# Altium footprint library 1.27插件排针.PcbLib: 49 footprints (part 2 of 4)
Each footprint in its own frame and in the unit in brackets; x right, y up, seen from the top. Pads: shape width x height; smd on the part's side, far side on the other; paste and mask are expansions set on the pad; w line width, h text height; cw(c..) or ccw(c..) is an arc to the next point about the centre after c.
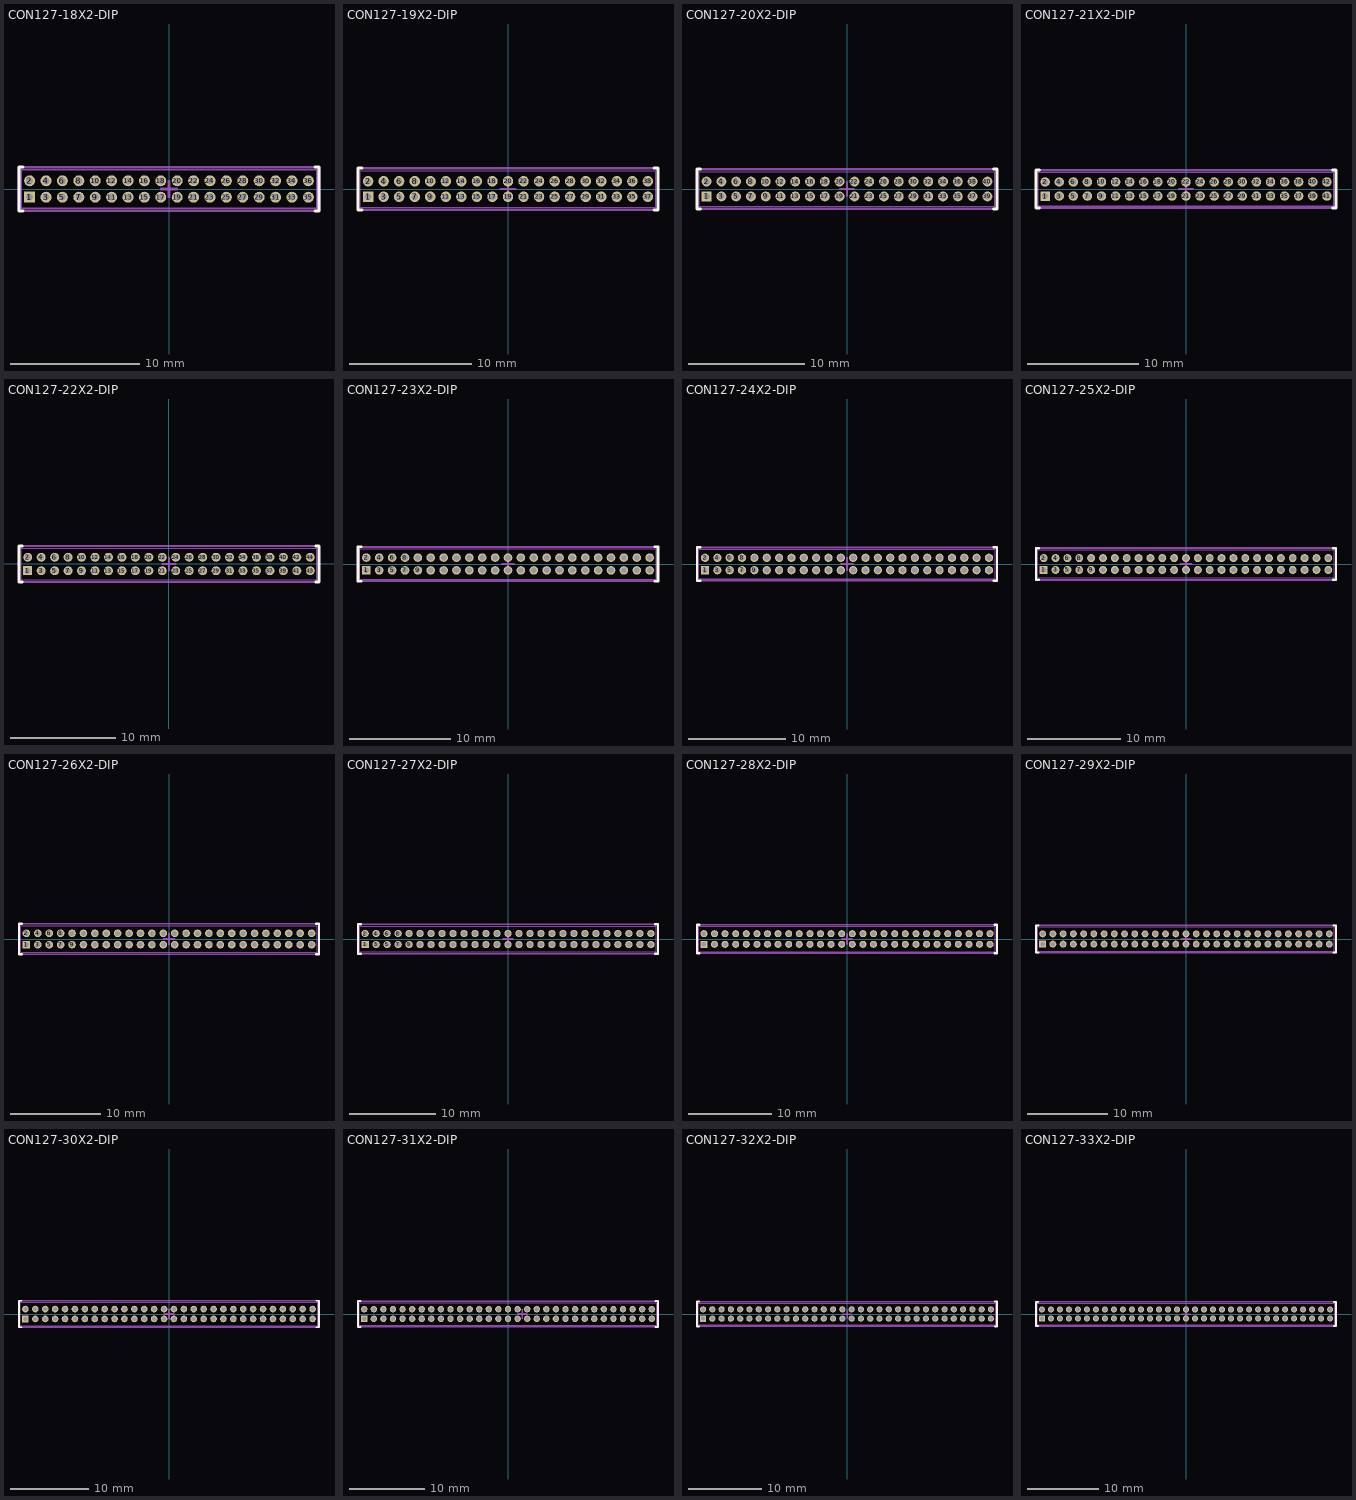
[diagram p1: the footprints below, top view; thin cyan lines are the x and y axes]

## CON127-18X2-DIP [mm] "1.27mm脚距18*2 双排针 -55°C to+105°C 450V AC"
height 3.5
pads (36):
  rect 0.85x0.85 hole 0.55 unplated: 1(-10.795,-0.635)
  round 0.85 hole 0.55 unplated: 2(-10.795,0.635) 3(-9.525,-0.635) 4(-9.525,0.635) 5(-8.255,-0.635) 6(-8.255,0.635) 7(-6.985,-0.635) 8(-6.985,0.635) 9(-5.715,-0.635) 10(-5.715,0.635) 11(-4.445,-0.635) 12(-4.445,0.635) 13(-3.175,-0.635) 14(-3.175,0.635) 15(-1.905,-0.635) 16(-1.905,0.635) 17(-0.635,-0.635) 18(-0.635,0.635) 19(0.635,-0.635) 20(0.635,0.635) 21(1.905,-0.635) 22(1.905,0.635) 23(3.175,-0.635) 24(3.175,0.635) 25(4.445,-0.635) 26(4.445,0.635) 27(5.715,-0.635) 28(5.715,0.635) 29(6.985,-0.635) 30(6.985,0.635) 31(8.255,-0.635) 32(8.255,0.635) 33(9.525,-0.635) 34(9.525,0.635) 35(10.795,-0.635) 36(10.795,0.635)
Top Overlay:
  lines w0.254: -11.303,-1.7 -11.62,-1.7 -11.62,1.7 -11.303,1.7 ; 11.303,-1.7 11.62,-1.7 11.62,1.7 11.303,1.7
Mechanical 13:
  lines w0.1: -11.43,-1.499 -11.43,1.501 ; -11.43,-1.499 11.43,-1.499 ; -11.43,-1.499 -11.43,1.501 ; -11.43,1.501 11.43,1.501 ; 11.43,-1.499 11.43,1.501 ; 11.43,-1.499 11.43,1.501
Mechanical 15:
  lines w0.2: -0.6,0 0.6,0 ; 0,-0.6 0,0.6 ; -11.62,-1.7 -11.62,1.7 11.62,1.7 11.62,-1.7 -11.62,-1.7
3D body: height 3.8, standoff -1.8, extent -11.43,-1.499 11.43,1.501

## CON127-19X2-DIP [mm] "1.27mm脚距19*2 双排针 -55°C to+105°C 450V AC"
height 3.5
pads (38):
  rect 0.85x0.85 hole 0.55 unplated: 1(-11.43,-0.635)
  round 0.85 hole 0.55 unplated: 2(-11.43,0.635) 3(-10.16,-0.635) 4(-10.16,0.635) 5(-8.89,-0.635) 6(-8.89,0.635) 7(-7.62,-0.635) 8(-7.62,0.635) 9(-6.35,-0.635) 10(-6.35,0.635) 11(-5.08,-0.635) 12(-5.08,0.635) 13(-3.81,-0.635) 14(-3.81,0.635) 15(-2.54,-0.635) 16(-2.54,0.635) 17(-1.27,-0.635) 18(-1.27,0.635) 19(0,-0.635) 20(0,0.635) 21(1.27,-0.635) 22(1.27,0.635) 23(2.54,-0.635) 24(2.54,0.635) 25(3.81,-0.635) 26(3.81,0.635) 27(5.08,-0.635) 28(5.08,0.635) 29(6.35,-0.635) 30(6.35,0.635) 31(7.62,-0.635) 32(7.62,0.635) 33(8.89,-0.635) 34(8.89,0.635) 35(10.16,-0.635) 36(10.16,0.635) 37(11.43,-0.635) 38(11.43,0.635)
Top Overlay:
  lines w0.254: -11.938,-1.7 -12.255,-1.7 -12.255,1.7 -11.938,1.7 ; 11.938,-1.7 12.255,-1.7 12.255,1.7 11.938,1.7
Mechanical 13:
  lines w0.1: -12.065,-1.499 -12.065,1.501 ; -12.065,-1.499 12.065,-1.499 ; -12.065,-1.499 -12.065,1.501 ; -12.065,1.501 12.065,1.501 ; 12.065,-1.499 12.065,1.501 ; 12.065,-1.499 12.065,1.501
Mechanical 15:
  lines w0.2: -0.6,0 0.6,0 ; 0,-0.6 0,0.6 ; -12.255,-1.7 -12.255,1.7 12.255,1.7 12.255,-1.7 -12.255,-1.7
3D body: height 3.8, standoff -1.8, extent -12.065,-1.499 12.065,1.501

## CON127-20X2-DIP [mm] "1.27mm脚距20*2 双排针 -55°C to+105°C 450V AC"
height 3.5
pads (40):
  rect 0.85x0.85 hole 0.55 unplated: 1(-12.065,-0.635)
  round 0.85 hole 0.55 unplated: 2(-12.065,0.635) 3(-10.795,-0.635) 4(-10.795,0.635) 5(-9.525,-0.635) 6(-9.525,0.635) 7(-8.255,-0.635) 8(-8.255,0.635) 9(-6.985,-0.635) 10(-6.985,0.635) 11(-5.715,-0.635) 12(-5.715,0.635) 13(-4.445,-0.635) 14(-4.445,0.635) 15(-3.175,-0.635) 16(-3.175,0.635) 17(-1.905,-0.635) 18(-1.905,0.635) 19(-0.635,-0.635) 20(-0.635,0.635) 21(0.635,-0.635) 22(0.635,0.635) 23(1.905,-0.635) 24(1.905,0.635) 25(3.175,-0.635) 26(3.175,0.635) 27(4.445,-0.635) 28(4.445,0.635) 29(5.715,-0.635) 30(5.715,0.635) 31(6.985,-0.635) 32(6.985,0.635) 33(8.255,-0.635) 34(8.255,0.635) 35(9.525,-0.635) 36(9.525,0.635) 37(10.795,-0.635) 38(10.795,0.635) 39(12.065,-0.635) 40(12.065,0.635)
Top Overlay:
  lines w0.254: -12.573,-1.7 -12.89,-1.7 -12.89,1.7 -12.573,1.7 ; 12.573,-1.7 12.89,-1.7 12.89,1.7 12.573,1.7
Mechanical 13:
  lines w0.1: -12.7,-1.499 -12.7,1.501 ; -12.7,-1.499 12.7,-1.499 ; -12.7,-1.499 -12.7,1.501 ; -12.7,1.501 12.7,1.501 ; 12.7,-1.499 12.7,1.501 ; 12.7,-1.499 12.7,1.501
Mechanical 15:
  lines w0.2: -0.6,0 0.6,0 ; 0,-0.6 0,0.6 ; -12.89,-1.7 -12.89,1.7 12.89,1.7 12.89,-1.7 -12.89,-1.7
3D body: height 3.8, standoff -1.8, extent -12.7,-1.499 12.7,1.501

## CON127-21X2-DIP [mm] "1.27mm脚距21*2 双排针 -55°C to+105°C 450V AC"
height 3.5
pads (42):
  rect 0.85x0.85 hole 0.55 unplated: 1(-12.7,-0.635)
  round 0.85 hole 0.55 unplated: 2(-12.7,0.635) 3(-11.43,-0.635) 4(-11.43,0.635) 5(-10.16,-0.635) 6(-10.16,0.635) 7(-8.89,-0.635) 8(-8.89,0.635) 9(-7.62,-0.635) 10(-7.62,0.635) 11(-6.35,-0.635) 12(-6.35,0.635) 13(-5.08,-0.635) 14(-5.08,0.635) 15(-3.81,-0.635) 16(-3.81,0.635) 17(-2.54,-0.635) 18(-2.54,0.635) 19(-1.27,-0.635) 20(-1.27,0.635) 21(0,-0.635) 22(0,0.635) 23(1.27,-0.635) 24(1.27,0.635) 25(2.54,-0.635) 26(2.54,0.635) 27(3.81,-0.635) 28(3.81,0.635) 29(5.08,-0.635) 30(5.08,0.635) 31(6.35,-0.635) 32(6.35,0.635) 33(7.62,-0.635) 34(7.62,0.635) 35(8.89,-0.635) 36(8.89,0.635) 37(10.16,-0.635) 38(10.16,0.635) 39(11.43,-0.635) 40(11.43,0.635) 41(12.7,-0.635) 42(12.7,0.635)
Top Overlay:
  lines w0.254: -13.208,-1.7 -13.525,-1.7 -13.525,1.7 -13.208,1.7 ; 13.208,-1.7 13.525,-1.7 13.525,1.7 13.208,1.7
Mechanical 13:
  lines w0.1: -13.335,-1.499 -13.335,1.501 ; -13.335,-1.499 13.335,-1.499 ; -13.335,-1.499 -13.335,1.501 ; -13.335,1.501 13.335,1.501 ; 13.335,-1.499 13.335,1.501 ; 13.335,-1.499 13.335,1.501
Mechanical 15:
  lines w0.2: -0.6,0 0.6,0 ; 0,-0.6 0,0.6 ; -13.525,-1.7 13.525,-1.7 13.525,1.7 -13.525,1.7 -13.525,-1.7
3D body: height 3.8, standoff -1.8, extent -13.335,-1.499 13.335,1.501

## CON127-22X2-DIP [mm] "1.27mm脚距22*2 双排针 -55°C to+105°C 450V AC"
height 3.5
pads (44):
  rect 0.85x0.85 hole 0.55 unplated: 1(-13.335,-0.635)
  round 0.85 hole 0.55 unplated: 2(-13.335,0.635) 3(-12.065,-0.635) 4(-12.065,0.635) 5(-10.795,-0.635) 6(-10.795,0.635) 7(-9.525,-0.635) 8(-9.525,0.635) 9(-8.255,-0.635) 10(-8.255,0.635) 11(-6.985,-0.635) 12(-6.985,0.635) 13(-5.715,-0.635) 14(-5.715,0.635) 15(-4.445,-0.635) 16(-4.445,0.635) 17(-3.175,-0.635) 18(-3.175,0.635) 19(-1.905,-0.635) 20(-1.905,0.635) 21(-0.635,-0.635) 22(-0.635,0.635) 23(0.635,-0.635) 24(0.635,0.635) 25(1.905,-0.635) 26(1.905,0.635) 27(3.175,-0.635) 28(3.175,0.635) 29(4.445,-0.635) 30(4.445,0.635) 31(5.715,-0.635) 32(5.715,0.635) 33(6.985,-0.635) 34(6.985,0.635) 35(8.255,-0.635) 36(8.255,0.635) 37(9.525,-0.635) 38(9.525,0.635) 39(10.795,-0.635) 40(10.795,0.635) 41(12.065,-0.635) 42(12.065,0.635) 43(13.335,-0.635) 44(13.335,0.635)
Top Overlay:
  lines w0.254: -13.843,-1.7 -14.16,-1.7 -14.16,1.7 -13.843,1.7 ; 13.843,-1.7 14.16,-1.7 14.16,1.7 13.843,1.7
Mechanical 13:
  lines w0.1: -13.97,-1.499 -13.97,1.501 ; -13.97,-1.499 13.97,-1.499 ; -13.97,-1.499 -13.97,1.501 ; -13.97,1.501 13.97,1.501 ; 13.97,-1.499 13.97,1.501 ; 13.97,-1.499 13.97,1.501
Mechanical 15:
  lines w0.2: -0.6,0 0.6,0 ; 0,-0.6 0,0.6 ; -14.16,-1.7 14.16,-1.7 14.16,1.7 -14.16,1.7 -14.16,-1.7
3D body: height 3.8, standoff -1.8, extent -13.97,-1.499 13.97,1.501

## CON127-23X2-DIP [mm] "1.27mm脚距23*2 双排针 -55°C to+105°C 450V AC"
height 3.5
pads (46):
  rect 0.85x0.85 hole 0.55 unplated: 1(-13.97,-0.635)
  round 0.85 hole 0.55 unplated: 2(-13.97,0.635) 3(-12.7,-0.635) 4(-12.7,0.635) 5(-11.43,-0.635) 6(-11.43,0.635) 7(-10.16,-0.635) 8(-10.16,0.635) 9(-8.89,-0.635) 10(-8.89,0.635) 11(-7.62,-0.635) 12(-7.62,0.635) 13(-6.35,-0.635) 14(-6.35,0.635) 15(-5.08,-0.635) 16(-5.08,0.635) 17(-3.81,-0.635) 18(-3.81,0.635) 19(-2.54,-0.635) 20(-2.54,0.635) 21(-1.27,-0.635) 22(-1.27,0.635) 23(0,-0.635) 24(0,0.635) 25(1.27,-0.635) 26(1.27,0.635) 27(2.54,-0.635) 28(2.54,0.635) 29(3.81,-0.635) 30(3.81,0.635) 31(5.08,-0.635) 32(5.08,0.635) 33(6.35,-0.635) 34(6.35,0.635) 35(7.62,-0.635) 36(7.62,0.635) 37(8.89,-0.635) 38(8.89,0.635) 39(10.16,-0.635) 40(10.16,0.635) 41(11.43,-0.635) 42(11.43,0.635) 43(12.7,-0.635) 44(12.7,0.635) 45(13.97,-0.635) 46(13.97,0.635)
Top Overlay:
  lines w0.254: -14.478,-1.7 -14.795,-1.7 -14.795,1.7 -14.478,1.7 ; 14.478,-1.7 14.795,-1.7 14.795,1.7 14.478,1.7
Mechanical 13:
  lines w0.1: -14.605,-1.499 -14.605,1.501 ; -14.605,-1.499 14.605,-1.499 ; -14.605,-1.499 -14.605,1.501 ; -14.605,1.501 14.605,1.501 ; 14.605,-1.499 14.605,1.501 ; 14.605,-1.499 14.605,1.501
Mechanical 15:
  lines w0.2: -0.6,0 0.6,0 ; 0,-0.6 0,0.6 ; -14.795,-1.7 -14.795,1.7 14.795,1.7 14.795,-1.7 -14.795,-1.7
3D body: height 3.8, standoff -1.8, extent -14.605,-1.499 14.605,1.501

## CON127-24X2-DIP [mm] "1.27mm脚距24*2 双排针 -55°C to+105°C 450V AC"
height 3.5
pads (48):
  rect 0.85x0.85 hole 0.55 unplated: 1(-14.605,-0.635)
  round 0.85 hole 0.55 unplated: 2(-14.605,0.635) 3(-13.335,-0.635) 4(-13.335,0.635) 5(-12.065,-0.635) 6(-12.065,0.635) 7(-10.795,-0.635) 8(-10.795,0.635) 9(-9.525,-0.635) 10(-9.525,0.635) 11(-8.255,-0.635) 12(-8.255,0.635) 13(-6.985,-0.635) 14(-6.985,0.635) 15(-5.715,-0.635) 16(-5.715,0.635) 17(-4.445,-0.635) 18(-4.445,0.635) 19(-3.175,-0.635) 20(-3.175,0.635) 21(-1.905,-0.635) 22(-1.905,0.635) 23(-0.635,-0.635) 24(-0.635,0.635) 25(0.635,-0.635) 26(0.635,0.635) 27(1.905,-0.635) 28(1.905,0.635) 29(3.175,-0.635) 30(3.175,0.635) 31(4.445,-0.635) 32(4.445,0.635) 33(5.715,-0.635) 34(5.715,0.635) 35(6.985,-0.635) 36(6.985,0.635) 37(8.255,-0.635) 38(8.255,0.635) 39(9.525,-0.635) 40(9.525,0.635) 41(10.795,-0.635) 42(10.795,0.635) 43(12.065,-0.635) 44(12.065,0.635) 45(13.335,-0.635) 46(13.335,0.635) 47(14.605,-0.635) 48(14.605,0.635)
Top Overlay:
  lines w0.254: -15.113,-1.7 -15.43,-1.7 -15.43,1.7 -15.113,1.7 ; 15.113,-1.7 15.43,-1.7 15.43,1.7 15.113,1.7
Mechanical 13:
  lines w0.1: -15.24,-1.499 -15.24,1.501 ; -15.24,-1.499 15.24,-1.499 ; -15.24,-1.499 -15.24,1.501 ; -15.24,1.501 15.24,1.501 ; 15.24,-1.499 15.24,1.501 ; 15.24,-1.499 15.24,1.501
Mechanical 15:
  lines w0.2: -0.6,0 0.6,0 ; 0,-0.6 0,0.6 ; -15.43,-1.7 15.43,-1.7 15.43,1.7 -15.43,1.7 -15.43,-1.7
3D body: height 3.8, standoff -1.8, extent -15.24,-1.499 15.24,1.501

## CON127-25X2-DIP [mm] "1.27mm脚距25*2 双排针 -55°C to+105°C 450V AC"
height 3.5
pads (50):
  rect 0.85x0.85 hole 0.55 unplated: 1(-15.24,-0.635)
  round 0.85 hole 0.55 unplated: 2(-15.24,0.635) 3(-13.97,-0.635) 4(-13.97,0.635) 5(-12.7,-0.635) 6(-12.7,0.635) 7(-11.43,-0.635) 8(-11.43,0.635) 9(-10.16,-0.635) 10(-10.16,0.635) 11(-8.89,-0.635) 12(-8.89,0.635) 13(-7.62,-0.635) 14(-7.62,0.635) 15(-6.35,-0.635) 16(-6.35,0.635) 17(-5.08,-0.635) 18(-5.08,0.635) 19(-3.81,-0.635) 20(-3.81,0.635) 21(-2.54,-0.635) 22(-2.54,0.635) 23(-1.27,-0.635) 24(-1.27,0.635) 25(0,-0.635) 26(0,0.635) 27(1.27,-0.635) 28(1.27,0.635) 29(2.54,-0.635) 30(2.54,0.635) 31(3.81,-0.635) 32(3.81,0.635) 33(5.08,-0.635) 34(5.08,0.635) 35(6.35,-0.635) 36(6.35,0.635) 37(7.62,-0.635) 38(7.62,0.635) 39(8.89,-0.635) 40(8.89,0.635) 41(10.16,-0.635) 42(10.16,0.635) 43(11.43,-0.635) 44(11.43,0.635) 45(12.7,-0.635) 46(12.7,0.635) 47(13.97,-0.635) 48(13.97,0.635) 49(15.24,-0.635) 50(15.24,0.635)
Top Overlay:
  lines w0.254: -15.748,-1.7 -16.065,-1.7 -16.065,1.7 -15.748,1.7 ; 15.748,-1.7 16.065,-1.7 16.065,1.7 15.748,1.7
Mechanical 13:
  lines w0.1: -15.875,-1.499 -15.875,1.501 ; -15.875,-1.499 15.875,-1.499 ; -15.875,-1.499 -15.875,1.501 ; -15.875,1.501 15.875,1.501 ; 15.875,-1.499 15.875,1.501 ; 15.875,-1.499 15.875,1.501
Mechanical 15:
  lines w0.2: -0.6,0 0.6,0 ; 0,-0.6 0,0.6 ; -16.065,-1.7 16.065,-1.7 16.065,1.7 -16.065,1.7 -16.065,-1.7
3D body: height 3.8, standoff -1.8, extent -15.875,-1.499 15.875,1.501

## CON127-26X2-DIP [mm] "1.27mm脚距26*2 双排针 -55°C to+105°C 450V AC"
height 3.5
pads (52):
  rect 0.85x0.85 hole 0.55 unplated: 1(-15.875,-0.635)
  round 0.85 hole 0.55 unplated: 2(-15.875,0.635) 3(-14.605,-0.635) 4(-14.605,0.635) 5(-13.335,-0.635) 6(-13.335,0.635) 7(-12.065,-0.635) 8(-12.065,0.635) 9(-10.795,-0.635) 10(-10.795,0.635) 11(-9.525,-0.635) 12(-9.525,0.635) 13(-8.255,-0.635) 14(-8.255,0.635) 15(-6.985,-0.635) 16(-6.985,0.635) 17(-5.715,-0.635) 18(-5.715,0.635) 19(-4.445,-0.635) 20(-4.445,0.635) 21(-3.175,-0.635) 22(-3.175,0.635) 23(-1.905,-0.635) 24(-1.905,0.635) 25(-0.635,-0.635) 26(-0.635,0.635) 27(0.635,-0.635) 28(0.635,0.635) 29(1.905,-0.635) 30(1.905,0.635) 31(3.175,-0.635) 32(3.175,0.635) 33(4.445,-0.635) 34(4.445,0.635) 35(5.715,-0.635) 36(5.715,0.635) 37(6.985,-0.635) 38(6.985,0.635) 39(8.255,-0.635) 40(8.255,0.635) 41(9.525,-0.635) 42(9.525,0.635) 43(10.795,-0.635) 44(10.795,0.635) 45(12.065,-0.635) 46(12.065,0.635) 47(13.335,-0.635) 48(13.335,0.635) 49(14.605,-0.635) 50(14.605,0.635) 51(15.875,-0.635) 52(15.875,0.635)
Top Overlay:
  lines w0.254: -16.383,-1.7 -16.7,-1.7 -16.7,1.7 -16.383,1.7 ; 16.383,-1.7 16.7,-1.7 16.7,1.7 16.383,1.7
Mechanical 13:
  lines w0.1: -16.51,-1.499 -16.51,1.501 ; -16.51,-1.499 16.51,-1.499 ; -16.51,-1.499 -16.51,1.501 ; -16.51,1.501 16.51,1.501 ; 16.51,-1.499 16.51,1.501 ; 16.51,-1.499 16.51,1.501
Mechanical 15:
  lines w0.2: -0.6,0 0.6,0 ; 0,-0.6 0,0.6 ; -16.7,-1.7 -16.7,1.7 16.7,1.7 16.7,-1.7 -16.7,-1.7
3D body: height 3.8, standoff -1.8, extent -16.51,-1.499 16.51,1.501

## CON127-27X2-DIP [mm] "1.27mm脚距27*2 双排针 -55°C to+105°C 450V AC"
height 3.5
pads (54):
  rect 0.85x0.85 hole 0.55 unplated: 1(-16.51,-0.635)
  round 0.85 hole 0.55 unplated: 2(-16.51,0.635) 3(-15.24,-0.635) 4(-15.24,0.635) 5(-13.97,-0.635) 6(-13.97,0.635) 7(-12.7,-0.635) 8(-12.7,0.635) 9(-11.43,-0.635) 10(-11.43,0.635) 11(-10.16,-0.635) 12(-10.16,0.635) 13(-8.89,-0.635) 14(-8.89,0.635) 15(-7.62,-0.635) 16(-7.62,0.635) 17(-6.35,-0.635) 18(-6.35,0.635) 19(-5.08,-0.635) 20(-5.08,0.635) 21(-3.81,-0.635) 22(-3.81,0.635) 23(-2.54,-0.635) 24(-2.54,0.635) 25(-1.27,-0.635) 26(-1.27,0.635) 27(0,-0.635) 28(0,0.635) 29(1.27,-0.635) 30(1.27,0.635) 31(2.54,-0.635) 32(2.54,0.635) 33(3.81,-0.635) 34(3.81,0.635) 35(5.08,-0.635) 36(5.08,0.635) 37(6.35,-0.635) 38(6.35,0.635) 39(7.62,-0.635) 40(7.62,0.635) 41(8.89,-0.635) 42(8.89,0.635) 43(10.16,-0.635) 44(10.16,0.635) 45(11.43,-0.635) 46(11.43,0.635) 47(12.7,-0.635) 48(12.7,0.635) 49(13.97,-0.635) 50(13.97,0.635) 51(15.24,-0.635) 52(15.24,0.635) 53(16.51,-0.635) 54(16.51,0.635)
Top Overlay:
  lines w0.254: -17.018,-1.7 -17.335,-1.7 -17.335,1.7 -17.018,1.7 ; 17.018,-1.7 17.335,-1.7 17.335,1.7 17.018,1.7
Mechanical 13:
  lines w0.1: -17.145,-1.499 -17.145,1.501 ; -17.145,-1.499 17.145,-1.499 ; -17.145,-1.499 -17.145,1.501 ; -17.145,1.501 17.145,1.501 ; 17.145,-1.499 17.145,1.501 ; 17.145,-1.499 17.145,1.501
Mechanical 15:
  lines w0.2: -0.6,0 0.6,0 ; 0,-0.6 0,0.6 ; -17.335,-1.7 17.335,-1.7 17.335,1.7 -17.335,1.7 -17.335,-1.7
3D body: height 3.8, standoff -1.8, extent -17.145,-1.499 17.145,1.501

## CON127-28X2-DIP [mm] "1.27mm脚距28*2 双排针 -55°C to+105°C 450V AC"
height 3.5
pads (56):
  rect 0.85x0.85 hole 0.55 unplated: 1(-17.145,-0.635)
  round 0.85 hole 0.55 unplated: 2(-17.145,0.635) 3(-15.875,-0.635) 4(-15.875,0.635) 5(-14.605,-0.635) 6(-14.605,0.635) 7(-13.335,-0.635) 8(-13.335,0.635) 9(-12.065,-0.635) 10(-12.065,0.635) 11(-10.795,-0.635) 12(-10.795,0.635) 13(-9.525,-0.635) 14(-9.525,0.635) 15(-8.255,-0.635) 16(-8.255,0.635) 17(-6.985,-0.635) 18(-6.985,0.635) 19(-5.715,-0.635) 20(-5.715,0.635) 21(-4.445,-0.635) 22(-4.445,0.635) 23(-3.175,-0.635) 24(-3.175,0.635) 25(-1.905,-0.635) 26(-1.905,0.635) 27(-0.635,-0.635) 28(-0.635,0.635) 29(0.635,-0.635) 30(0.635,0.635) 31(1.905,-0.635) 32(1.905,0.635) 33(3.175,-0.635) 34(3.175,0.635) 35(4.445,-0.635) 36(4.445,0.635) 37(5.715,-0.635) 38(5.715,0.635) 39(6.985,-0.635) 40(6.985,0.635) 41(8.255,-0.635) 42(8.255,0.635) 43(9.525,-0.635) 44(9.525,0.635) 45(10.795,-0.635) 46(10.795,0.635) 47(12.065,-0.635) 48(12.065,0.635) 49(13.335,-0.635) 50(13.335,0.635) 51(14.605,-0.635) 52(14.605,0.635) 53(15.875,-0.635) 54(15.875,0.635) 55(17.145,-0.635) 56(17.145,0.635)
Top Overlay:
  lines w0.254: -17.653,-1.7 -17.97,-1.7 -17.97,1.7 -17.653,1.7 ; 17.653,-1.7 17.97,-1.7 17.97,1.7 17.653,1.7
Mechanical 13:
  lines w0.1: -17.78,-1.499 -17.78,1.501 ; -17.78,-1.499 17.78,-1.499 ; -17.78,-1.499 -17.78,1.501 ; -17.78,1.501 17.78,1.501 ; 17.78,-1.499 17.78,1.501 ; 17.78,-1.499 17.78,1.501
Mechanical 15:
  lines w0.2: -0.6,0 0.6,0 ; 0,-0.6 0,0.6 ; -17.97,-1.7 17.97,-1.7 17.97,1.7 -17.97,1.7 -17.97,-1.7
3D body: height 3.8, standoff -1.8, extent -17.78,-1.499 17.78,1.501

## CON127-29X2-DIP [mm] "1.27mm脚距29*2 双排针 -55°C to+105°C 450V AC"
height 3.5
pads (58):
  rect 0.85x0.85 hole 0.55 unplated: 1(-17.78,-0.635)
  round 0.85 hole 0.55 unplated: 2(-17.78,0.635) 3(-16.51,-0.635) 4(-16.51,0.635) 5(-15.24,-0.635) 6(-15.24,0.635) 7(-13.97,-0.635) 8(-13.97,0.635) 9(-12.7,-0.635) 10(-12.7,0.635) 11(-11.43,-0.635) 12(-11.43,0.635) 13(-10.16,-0.635) 14(-10.16,0.635) 15(-8.89,-0.635) 16(-8.89,0.635) 17(-7.62,-0.635) 18(-7.62,0.635) 19(-6.35,-0.635) 20(-6.35,0.635) 21(-5.08,-0.635) 22(-5.08,0.635) 23(-3.81,-0.635) 24(-3.81,0.635) 25(-2.54,-0.635) 26(-2.54,0.635) 27(-1.27,-0.635) 28(-1.27,0.635) 29(0,-0.635) 30(0,0.635) 31(1.27,-0.635) 32(1.27,0.635) 33(2.54,-0.635) 34(2.54,0.635) 35(3.81,-0.635) 36(3.81,0.635) 37(5.08,-0.635) 38(5.08,0.635) 39(6.35,-0.635) 40(6.35,0.635) 41(7.62,-0.635) 42(7.62,0.635) 43(8.89,-0.635) 44(8.89,0.635) 45(10.16,-0.635) 46(10.16,0.635) 47(11.43,-0.635) 48(11.43,0.635) 49(12.7,-0.635) 50(12.7,0.635) 51(13.97,-0.635) 52(13.97,0.635) 53(15.24,-0.635) 54(15.24,0.635) 55(16.51,-0.635) 56(16.51,0.635) 57(17.78,-0.635) 58(17.78,0.635)
Top Overlay:
  lines w0.254: -18.288,-1.7 -18.605,-1.7 -18.605,1.7 -18.288,1.7 ; 18.288,-1.7 18.605,-1.7 18.605,1.7 18.288,1.7
Mechanical 13:
  lines w0.1: -18.415,-1.499 -18.415,1.501 ; -18.415,-1.499 18.415,-1.499 ; -18.415,-1.499 -18.415,1.501 ; -18.415,1.501 18.415,1.501 ; 18.415,-1.499 18.415,1.501 ; 18.415,-1.499 18.415,1.501
Mechanical 15:
  lines w0.2: -0.6,0 0.6,0 ; 0,-0.6 0,0.6 ; -18.605,-1.7 18.605,-1.7 18.605,1.7 -18.605,1.7 -18.605,-1.7
3D body: height 3.8, standoff -1.8, extent -18.415,-1.499 18.415,1.501

## CON127-30X2-DIP [mm] "1.27mm脚距30*2 双排针 -55°C to+105°C 450V AC"
height 3.5
pads (60):
  rect 0.85x0.85 hole 0.55 unplated: 1(-18.415,-0.635)
  round 0.85 hole 0.55 unplated: 2(-18.415,0.635) 3(-17.145,-0.635) 4(-17.145,0.635) 5(-15.875,-0.635) 6(-15.875,0.635) 7(-14.605,-0.635) 8(-14.605,0.635) 9(-13.335,-0.635) 10(-13.335,0.635) 11(-12.065,-0.635) 12(-12.065,0.635) 13(-10.795,-0.635) 14(-10.795,0.635) 15(-9.525,-0.635) 16(-9.525,0.635) 17(-8.255,-0.635) 18(-8.255,0.635) 19(-6.985,-0.635) 20(-6.985,0.635) 21(-5.715,-0.635) 22(-5.715,0.635) 23(-4.445,-0.635) 24(-4.445,0.635) 25(-3.175,-0.635) 26(-3.175,0.635) 27(-1.905,-0.635) 28(-1.905,0.635) 29(-0.635,-0.635) 30(-0.635,0.635) 31(0.635,-0.635) 32(0.635,0.635) 33(1.905,-0.635) 34(1.905,0.635) 35(3.175,-0.635) 36(3.175,0.635) 37(4.445,-0.635) 38(4.445,0.635) 39(5.715,-0.635) 40(5.715,0.635) 41(6.985,-0.635) 42(6.985,0.635) 43(8.255,-0.635) 44(8.255,0.635) 45(9.525,-0.635) 46(9.525,0.635) 47(10.795,-0.635) 48(10.795,0.635) 49(12.065,-0.635) 50(12.065,0.635) 51(13.335,-0.635) 52(13.335,0.635) 53(14.605,-0.635) 54(14.605,0.635) 55(15.875,-0.635) 56(15.875,0.635) 57(17.145,-0.635) 58(17.145,0.635) 59(18.415,-0.635) 60(18.415,0.635)
Top Overlay:
  lines w0.254: -18.923,-1.7 -19.24,-1.7 -19.24,1.7 -18.923,1.7 ; 18.923,-1.7 19.24,-1.7 19.24,1.7 18.923,1.7
Mechanical 13:
  lines w0.1: -19.05,-1.499 -19.05,1.501 ; -19.05,-1.499 19.05,-1.499 ; -19.05,-1.499 -19.05,1.501 ; -19.05,1.501 19.05,1.501 ; 19.05,-1.499 19.05,1.501 ; 19.05,-1.499 19.05,1.501
Mechanical 15:
  lines w0.2: -0.6,0 0.6,0 ; 0,-0.6 0,0.6 ; -19.24,-1.7 19.24,-1.7 19.24,1.7 -19.24,1.7 -19.24,-1.7
3D body: height 3.8, standoff -1.8, extent -19.05,-1.499 19.05,1.501

## CON127-31X2-DIP [mm] "1.27mm脚距31*2 双排针 -55°C to+105°C 450V AC"
height 3.5
pads (62):
  rect 0.85x0.85 hole 0.55 unplated: 1(-19.05,-0.635)
  round 0.85 hole 0.55 unplated: 2(-19.05,0.635) 3(-17.78,-0.635) 4(-17.78,0.635) 5(-16.51,-0.635) 6(-16.51,0.635) 7(-15.24,-0.635) 8(-15.24,0.635) 9(-13.97,-0.635) 10(-13.97,0.635) 11(-12.7,-0.635) 12(-12.7,0.635) 13(-11.43,-0.635) 14(-11.43,0.635) 15(-10.16,-0.635) 16(-10.16,0.635) 17(-8.89,-0.635) 18(-8.89,0.635) 19(-7.62,-0.635) 20(-7.62,0.635) 21(-6.35,-0.635) 22(-6.35,0.635) 23(-5.08,-0.635) 24(-5.08,0.635) 25(-3.81,-0.635) 26(-3.81,0.635) 27(-2.54,-0.635) 28(-2.54,0.635) 29(-1.27,-0.635) 30(-1.27,0.635) 31(0,-0.635) 32(0,0.635) 33(1.27,-0.635) 34(1.27,0.635) 35(2.54,-0.635) 36(2.54,0.635) 37(3.81,-0.635) 38(3.81,0.635) 39(5.08,-0.635) 40(5.08,0.635) 41(6.35,-0.635) 42(6.35,0.635) 43(7.62,-0.635) 44(7.62,0.635) 45(8.89,-0.635) 46(8.89,0.635) 47(10.16,-0.635) 48(10.16,0.635) 49(11.43,-0.635) 50(11.43,0.635) 51(12.7,-0.635) 52(12.7,0.635) 53(13.97,-0.635) 54(13.97,0.635) 55(15.24,-0.635) 56(15.24,0.635) 57(16.51,-0.635) 58(16.51,0.635) 59(17.78,-0.635) 60(17.78,0.635) 61(19.05,-0.635) 62(19.05,0.635)
Top Overlay:
  lines w0.254: -19.558,-1.7 -19.875,-1.7 -19.875,1.7 -19.558,1.7 ; 19.558,-1.7 19.875,-1.7 19.875,1.7 19.558,1.7
Mechanical 13:
  lines w0.1: -19.685,-1.499 -19.685,1.501 ; -19.685,-1.499 19.685,-1.499 ; -19.685,-1.499 -19.685,1.501 ; -19.685,1.501 19.685,1.501 ; 19.685,-1.499 19.685,1.501 ; 19.685,-1.499 19.685,1.501
Mechanical 15:
  lines w0.2: 1.305,0 2.505,0 ; 1.905,-0.6 1.905,0.6 ; -19.875,-1.7 19.875,-1.7 19.875,1.7 -19.875,1.7 -19.875,-1.7
3D body: height 3.8, standoff -1.8, extent -19.685,-1.499 19.685,1.501

## CON127-32X2-DIP [mm] "1.27mm脚距32*2 双排针 -55°C to+105°C 450V AC"
height 3.5
pads (64):
  rect 0.85x0.85 hole 0.55 unplated: 1(-19.685,-0.635)
  round 0.85 hole 0.55 unplated: 2(-19.685,0.635) 3(-18.415,-0.635) 4(-18.415,0.635) 5(-17.145,-0.635) 6(-17.145,0.635) 7(-15.875,-0.635) 8(-15.875,0.635) 9(-14.605,-0.635) 10(-14.605,0.635) 11(-13.335,-0.635) 12(-13.335,0.635) 13(-12.065,-0.635) 14(-12.065,0.635) 15(-10.795,-0.635) 16(-10.795,0.635) 17(-9.525,-0.635) 18(-9.525,0.635) 19(-8.255,-0.635) 20(-8.255,0.635) 21(-6.985,-0.635) 22(-6.985,0.635) 23(-5.715,-0.635) 24(-5.715,0.635) 25(-4.445,-0.635) 26(-4.445,0.635) 27(-3.175,-0.635) 28(-3.175,0.635) 29(-1.905,-0.635) 30(-1.905,0.635) 31(-0.635,-0.635) 32(-0.635,0.635) 33(0.635,-0.635) 34(0.635,0.635) 35(1.905,-0.635) 36(1.905,0.635) 37(3.175,-0.635) 38(3.175,0.635) 39(4.445,-0.635) 40(4.445,0.635) 41(5.715,-0.635) 42(5.715,0.635) 43(6.985,-0.635) 44(6.985,0.635) 45(8.255,-0.635) 46(8.255,0.635) 47(9.525,-0.635) 48(9.525,0.635) 49(10.795,-0.635) 50(10.795,0.635) 51(12.065,-0.635) 52(12.065,0.635) 53(13.335,-0.635) 54(13.335,0.635) 55(14.605,-0.635) 56(14.605,0.635) 57(15.875,-0.635) 58(15.875,0.635) 59(17.145,-0.635) 60(17.145,0.635) 61(18.415,-0.635) 62(18.415,0.635) 63(19.685,-0.635) 64(19.685,0.635)
Top Overlay:
  lines w0.254: -20.193,-1.7 -20.51,-1.7 -20.51,1.7 -20.193,1.7 ; 20.193,-1.7 20.51,-1.7 20.51,1.7 20.193,1.7
Mechanical 13:
  lines w0.1: -20.32,-1.499 -20.32,1.501 ; -20.32,-1.499 20.32,-1.499 ; -20.32,-1.499 -20.32,1.501 ; -20.32,1.501 20.32,1.501 ; 20.32,-1.499 20.32,1.501 ; 20.32,-1.499 20.32,1.501
Mechanical 15:
  lines w0.2: -0.6,0 0.6,0 ; 0,-0.6 0,0.6 ; -20.51,-1.7 20.51,-1.7 20.51,1.7 -20.51,1.7 -20.51,-1.7
3D body: height 3.8, standoff -1.8, extent -20.32,-1.499 20.32,1.501

## CON127-33X2-DIP [mm] "1.27mm脚距33*2 双排针 -55°C to+105°C 450V AC"
height 3.5
pads (66):
  rect 0.85x0.85 hole 0.55 unplated: 1(-20.32,-0.635)
  round 0.85 hole 0.55 unplated: 2(-20.32,0.635) 3(-19.05,-0.635) 4(-19.05,0.635) 5(-17.78,-0.635) 6(-17.78,0.635) 7(-16.51,-0.635) 8(-16.51,0.635) 9(-15.24,-0.635) 10(-15.24,0.635) 11(-13.97,-0.635) 12(-13.97,0.635) 13(-12.7,-0.635) 14(-12.7,0.635) 15(-11.43,-0.635) 16(-11.43,0.635) 17(-10.16,-0.635) 18(-10.16,0.635) 19(-8.89,-0.635) 20(-8.89,0.635) 21(-7.62,-0.635) 22(-7.62,0.635) 23(-6.35,-0.635) 24(-6.35,0.635) 25(-5.08,-0.635) 26(-5.08,0.635) 27(-3.81,-0.635) 28(-3.81,0.635) 29(-2.54,-0.635) 30(-2.54,0.635) 31(-1.27,-0.635) 32(-1.27,0.635) 33(0,-0.635) 34(0,0.635) 35(1.27,-0.635) 36(1.27,0.635) 37(2.54,-0.635) 38(2.54,0.635) 39(3.81,-0.635) 40(3.81,0.635) 41(5.08,-0.635) 42(5.08,0.635) 43(6.35,-0.635) 44(6.35,0.635) 45(7.62,-0.635) 46(7.62,0.635) 47(8.89,-0.635) 48(8.89,0.635) 49(10.16,-0.635) 50(10.16,0.635) 51(11.43,-0.635) 52(11.43,0.635) 53(12.7,-0.635) 54(12.7,0.635) 55(13.97,-0.635) 56(13.97,0.635) 57(15.24,-0.635) 58(15.24,0.635) 59(16.51,-0.635) 60(16.51,0.635) 61(17.78,-0.635) 62(17.78,0.635) 63(19.05,-0.635) 64(19.05,0.635) 65(20.32,-0.635) 66(20.32,0.635)
Top Overlay:
  lines w0.254: -20.828,-1.7 -21.145,-1.7 -21.145,1.7 -20.828,1.7 ; 20.828,-1.7 21.145,-1.7 21.145,1.7 20.828,1.7
Mechanical 13:
  lines w0.1: -20.955,-1.499 -20.955,1.501 ; -20.955,-1.499 20.955,-1.499 ; -20.955,-1.499 -20.955,1.501 ; -20.955,1.501 20.955,1.501 ; 20.955,-1.499 20.955,1.501 ; 20.955,-1.499 20.955,1.501
Mechanical 15:
  lines w0.2: -0.6,0 0.6,0 ; 0,-0.6 0,0.6 ; -21.145,-1.7 21.145,-1.7 21.145,1.7 -21.145,1.7 -21.145,-1.7
3D body: height 3.8, standoff -1.8, extent -20.955,-1.499 20.955,1.501